# Altium footprint library WR-TBL_Pluggable PCB Header.PcbLib: 719 footprints (part 12 of 45)
Each footprint in its own frame and in the unit in brackets; x right, y up, seen from the top. Pads: shape width x height; smd on the part's side, far side on the other; paste and mask are expansions set on the pad; w line width, h text height; cw(c..) or ccw(c..) is an arc to the next point about the centre after c.
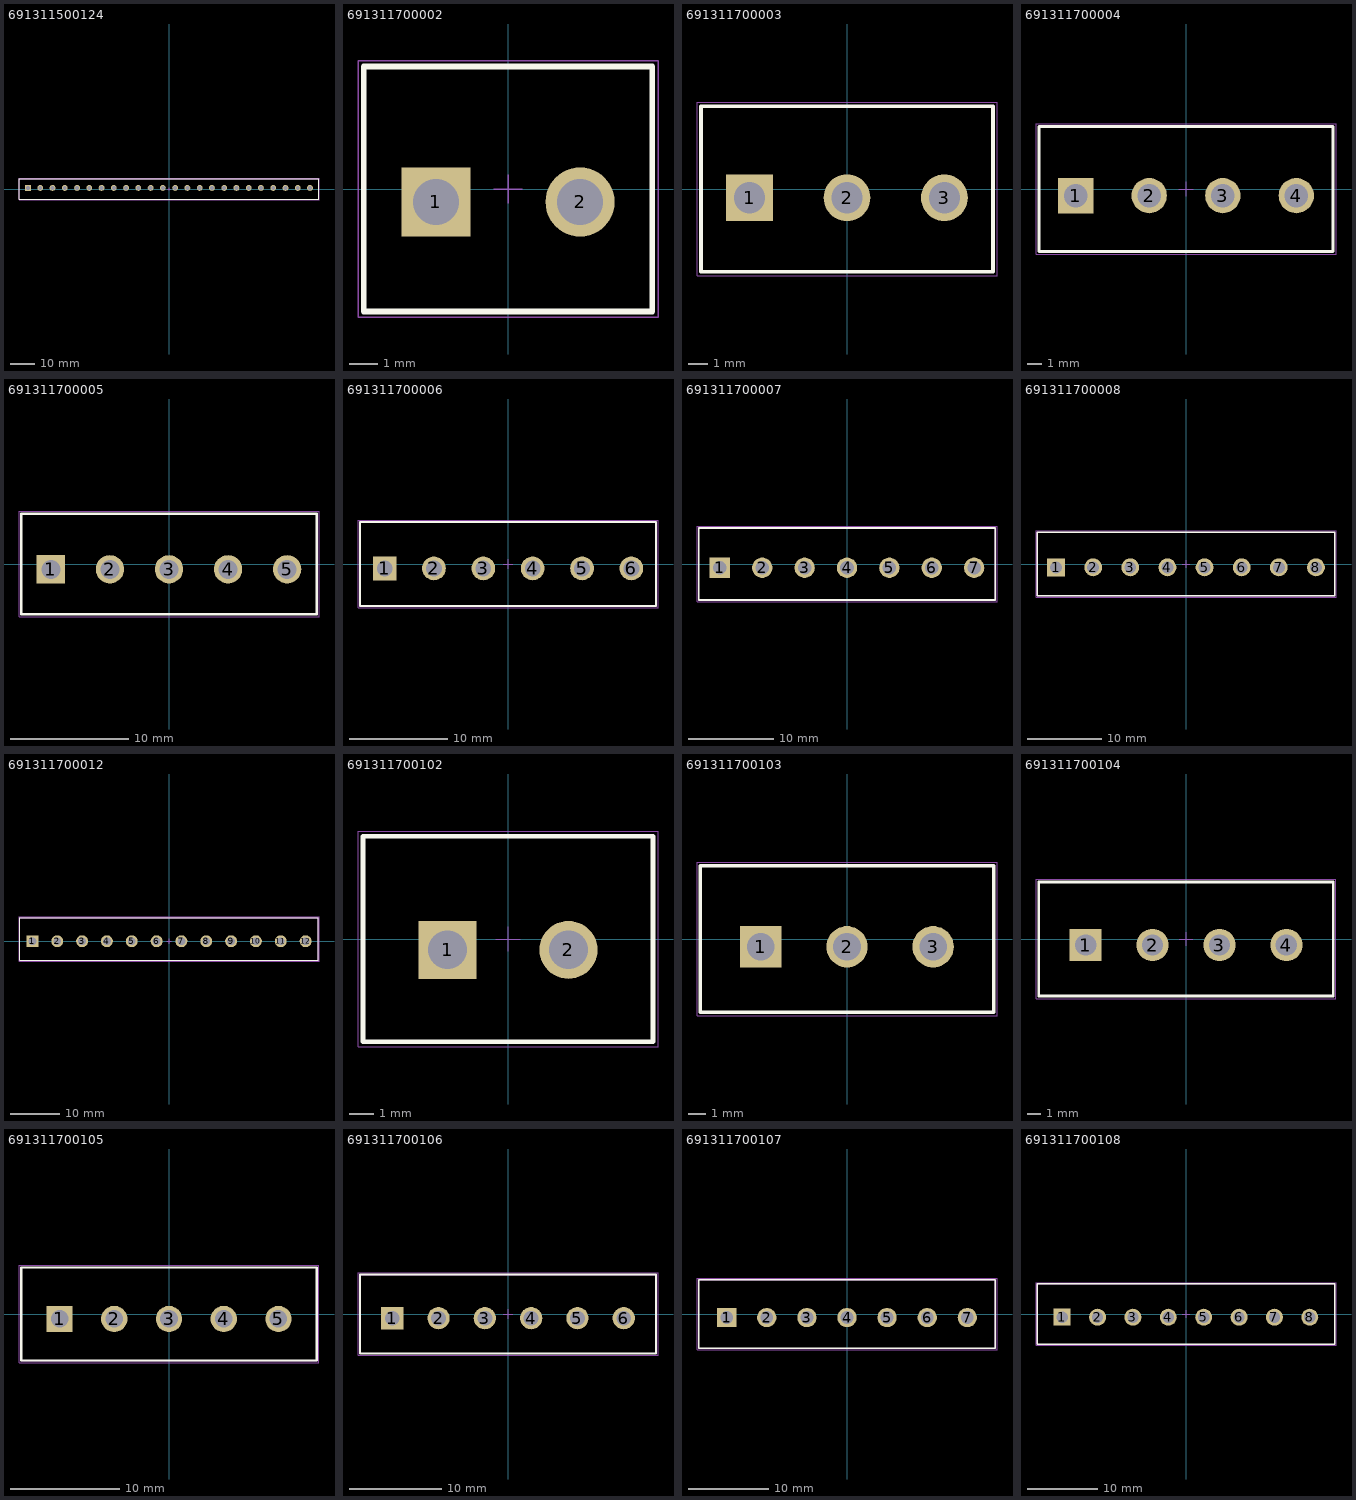
[diagram p11: the footprints below, top view; thin cyan lines are the x and y axes]

## 691311500124 [mm] "5,08mm - PCB Headers - Vertical - Closed ends -24p"
height 12
pads (24):
  rect 2.4x2.4 hole 1.6: 1(-58.42,0.45)
  round 2.4 hole 1.6: 2(-53.34,0.45) 3(-48.26,0.45) 4(-43.18,0.45) 5(-38.1,0.45) 6(-33.02,0.45) 7(-27.94,0.45) 8(-22.86,0.45) 9(-17.78,0.45) 10(-12.7,0.45) 11(-7.62,0.45) 12(-2.54,0.45) 13(2.54,0.45) 14(7.62,0.45) 15(12.7,0.45) 16(17.78,0.45) 17(22.86,0.45) 18(27.94,0.45) 19(33.02,0.45) 20(38.1,0.45) 21(43.18,0.45) 22(48.26,0.45) 23(53.34,0.45) 24(58.42,0.45)
Top Overlay:
  lines w0.2: -61.96,-4.25 61.96,-4.25 61.96,4.25 -61.96,4.25 -61.96,-4.25
Mechanical 13:
  lines w0.1: -61.96,-4.25 -61.96,4.25 61.96,4.25 61.96,-4.25 -61.96,-4.25
Mechanical 15:
  lines w0.05: -0.5,0 0.5,0 ; 0,-0.5 0,0.5 ; -62.16,-4.45 62.16,-4.45 62.16,4.45 -62.16,4.45 -62.16,-4.45
3D body "691311500124.stp": height 12.05, standoff -3.95, extent -61.96,-4.25 61.96,4.25

## 691311700002 [mm] "5.00mm - Open Vertical PCB Header - 02p"
height 12
pads (2):
  rect 2.4x2.4 hole 1.6: 1(-2.5,-0.45)
  round 2.4 hole 1.6: 2(2.5,-0.45)
Top Overlay:
  lines w0.2: -5,-4.25 5,-4.25 5,4.25 -5,4.25 -5,-4.25
Mechanical 13:
  lines w0.1: -5,-4.25 -5,4.25 5,4.25 5,-4.25 -5,-4.25
Mechanical 15:
  lines w0.05: -0.5,0 0.5,0 ; 0,-0.5 0,0.5 ; -5.2,-4.45 5.2,-4.45 5.2,4.45 -5.2,4.45 -5.2,-4.45
3D body "691311700002.stp": height 12.1, standoff -3.9, extent -5,-4.25 5,4.25

## 691311700003 [mm] "5.00mm - Open Vertical PCB Header - 03p"
height 12
pads (3):
  rect 2.4x2.4 hole 1.6: 1(-5,-0.45)
  round 2.4 hole 1.6: 2(0,-0.45) 3(5,-0.45)
Top Overlay:
  lines w0.2: -7.5,-4.25 7.5,-4.25 7.5,4.25 -7.5,4.25 -7.5,-4.25
Mechanical 13:
  lines w0.1: -7.5,-4.25 -7.5,4.25 7.5,4.25 7.5,-4.25 -7.5,-4.25
Mechanical 15:
  lines w0.05: -0.5,0 0.5,0 ; 0,-0.5 0,0.5 ; -7.7,-4.45 7.7,-4.45 7.7,4.45 -7.7,4.45 -7.7,-4.45
3D body "691311700003.stp": height 12.1, standoff -3.9, extent -7.5,-4.25 7.5,4.25

## 691311700004 [mm] "5.00mm - Open Vertical PCB Header - 04p"
height 12
pads (4):
  rect 2.4x2.4 hole 1.6: 1(-7.5,-0.45)
  round 2.4 hole 1.6: 2(-2.5,-0.45) 3(2.5,-0.45) 4(7.5,-0.45)
Top Overlay:
  lines w0.2: -10,-4.25 10,-4.25 10,4.25 -10,4.25 -10,-4.25
Mechanical 13:
  lines w0.1: -10,-4.25 -10,4.25 10,4.25 10,-4.25 -10,-4.25
Mechanical 15:
  lines w0.05: -0.5,0 0.5,0 ; 0,-0.5 0,0.5 ; -10.2,-4.45 10.2,-4.45 10.2,4.45 -10.2,4.45 -10.2,-4.45
3D body "691311700004.stp": height 12.1, standoff -3.9, extent -10,-4.25 10,4.25

## 691311700005 [mm] "5.00mm - Open Vertical PCB Header - 05p"
height 12
pads (5):
  rect 2.4x2.4 hole 1.6: 1(-10,-0.45)
  round 2.4 hole 1.6: 2(-5,-0.45) 3(0,-0.45) 4(5,-0.45) 5(10,-0.45)
Top Overlay:
  lines w0.2: -12.5,-4.25 12.5,-4.25 12.5,4.25 -12.5,4.25 -12.5,-4.25
Mechanical 13:
  lines w0.1: -12.5,-4.25 -12.5,4.25 12.5,4.25 12.5,-4.25 -12.5,-4.25
Mechanical 15:
  lines w0.05: -0.5,0 0.5,0 ; 0,-0.5 0,0.5 ; -12.7,-4.45 12.7,-4.45 12.7,4.45 -12.7,4.45 -12.7,-4.45
3D body "691311700005.stp": height 12.1, standoff -3.9, extent -12.5,-4.25 12.5,4.25

## 691311700006 [mm] "5.00mm - Open Vertical PCB Header - 06p"
height 12
pads (6):
  rect 2.4x2.4 hole 1.6: 1(-12.5,-0.45)
  round 2.4 hole 1.6: 2(-7.5,-0.45) 3(-2.5,-0.45) 4(2.5,-0.45) 5(7.5,-0.45) 6(12.5,-0.45)
Top Overlay:
  lines w0.2: -15,-4.25 -15,4.25 15,4.25 15,-4.25 -15,-4.25
Mechanical 13:
  lines w0.1: -15,-4.25 15,-4.25 15,4.25 -15,4.25 -15,-4.25
Mechanical 15:
  lines w0.05: -0.5,0 0.5,0 ; 0,-0.5 0,0.5 ; -15.2,-4.45 -15.2,4.45 15.2,4.45 15.2,-4.45 -15.2,-4.45
3D body "691311700006.stp": height 12.1, standoff -3.9, extent -15,-4.25 15,4.25

## 691311700007 [mm] "5.00mm - Open Vertical PCB Header - 07p"
height 12
pads (7):
  rect 2.4x2.4 hole 1.6: 1(-15,-0.45)
  round 2.4 hole 1.6: 2(-10,-0.45) 3(-5,-0.45) 4(0,-0.45) 5(5,-0.45) 6(10,-0.45) 7(15,-0.45)
Top Overlay:
  lines w0.2: -17.5,-4.25 -17.5,4.25 17.5,4.25 17.5,-4.25 -17.5,-4.25
Mechanical 13:
  lines w0.1: -17.5,-4.25 17.5,-4.25 17.5,4.25 -17.5,4.25 -17.5,-4.25
Mechanical 15:
  lines w0.05: -0.5,0 0.5,0 ; 0,-0.5 0,0.5 ; -17.7,-4.45 -17.7,4.45 17.7,4.45 17.7,-4.45 -17.7,-4.45
3D body "691311700007.stp": height 12.1, standoff -3.9, extent -17.5,-4.25 17.5,4.25

## 691311700008 [mm] "5.00mm - Open Vertical PCB Header - 08p"
height 12
pads (8):
  rect 2.4x2.4 hole 1.6: 1(-17.5,-0.45)
  round 2.4 hole 1.6: 2(-12.5,-0.45) 3(-7.5,-0.45) 4(-2.5,-0.45) 5(2.5,-0.45) 6(7.5,-0.45) 7(12.5,-0.45) 8(17.5,-0.45)
Top Overlay:
  lines w0.2: -20,-4.25 -20,4.25 20,4.25 20,-4.25 -20,-4.25
Mechanical 13:
  lines w0.1: -20,-4.25 20,-4.25 20,4.25 -20,4.25 -20,-4.25
Mechanical 15:
  lines w0.05: -0.5,0 0.5,0 ; 0,-0.5 0,0.5 ; -20.2,-4.45 -20.2,4.45 20.2,4.45 20.2,-4.45 -20.2,-4.45
3D body "691311700008.stp": height 12.1, standoff -3.9, extent -20,-4.25 20,4.25

## 691311700012 [mm] "5.00mm - Open Vertical PCB Header - 12p"
height 12
pads (12):
  rect 2.4x2.4 hole 1.6: 1(-27.5,0)
  round 2.4 hole 1.6: 2(-22.5,0) 3(-17.5,0) 4(-12.5,0) 5(-7.5,0) 6(-2.5,0) 7(2.5,0) 8(7.5,0) 9(12.5,0) 10(17.5,0) 11(22.5,0) 12(27.5,0)
Top Overlay:
  lines w0.2: -30,-3.8 -30,4.7 30,4.7 30,-3.8 -30,-3.8
Mechanical 13:
  lines w0.1: -30,-3.8 30,-3.8 30,4.7 -30,4.7 -30,-3.8
Mechanical 15:
  lines w0.05: -0.5,0 0.5,0 ; 0,-0.5 0,0.5 ; -30.2,-4 -30.2,4.9 30.2,4.9 30.2,-4 -30.2,-4
3D body "691311700012.stp": height 12.1, standoff -3.9, extent -30,-3.8 30,4.7

## 691311700102 [mm] "5.00mm - PCB Vertical Closed - 02p"
height 12
pads (2):
  rect 2.4x2.4 hole 1.6: 1(-2.5,-0.45)
  round 2.4 hole 1.6: 2(2.5,-0.45)
Top Overlay:
  lines w0.2: -6,-4.25 -6,4.25 6,4.25 6,-4.25 -6,-4.25
Mechanical 13:
  lines w0.1: -6,-4.25 6,-4.25 6,4.25 -6,4.25 -6,-4.25
Mechanical 15:
  lines w0.05: -0.5,0 0.5,0 ; 0,-0.5 0,0.5 ; -6.2,-4.45 6.2,-4.45 6.2,4.45 -6.2,4.45 -6.2,-4.45
3D body "691311700102.stp": height 12.1, standoff -3.9, extent -6,-4.25 6,4.25

## 691311700103 [mm] "5.00mm - PCB Vertical Closed - 03p"
height 12
pads (3):
  rect 2.4x2.4 hole 1.6: 1(-5,-0.45)
  round 2.4 hole 1.6: 2(0,-0.45) 3(5,-0.45)
Top Overlay:
  lines w0.2: -8.5,-4.25 8.5,-4.25 8.5,4.25 -8.5,4.25 -8.5,-4.25
Mechanical 13:
  lines w0.1: -8.5,-4.25 -8.5,4.25 8.5,4.25 8.5,-4.25 -8.5,-4.25
Mechanical 15:
  lines w0.05: -0.5,0 0.5,0 ; 0,-0.5 0,0.5 ; -8.7,-4.45 -8.7,4.45 8.7,4.45 8.7,-4.45 -8.7,-4.45
3D body "691311700103.stp": height 12.1, standoff -3.9, extent -8.5,-4.25 8.5,4.25

## 691311700104 [mm] "5.00mm - PCB Vertical Closed - 04p"
height 12
pads (4):
  rect 2.4x2.4 hole 1.6: 1(-7.5,-0.45)
  round 2.4 hole 1.6: 2(-2.5,-0.45) 3(2.5,-0.45) 4(7.5,-0.45)
Top Overlay:
  lines w0.2: -11,-4.25 11,-4.25 11,4.25 -11,4.25 -11,-4.25
Mechanical 13:
  lines w0.1: -11,-4.25 -11,4.25 11,4.25 11,-4.25 -11,-4.25
Mechanical 15:
  lines w0.05: -0.5,0 0.5,0 ; 0,-0.5 0,0.5 ; -11.2,-4.45 -11.2,4.45 11.2,4.45 11.2,-4.45 -11.2,-4.45
3D body "691311700104.stp": height 12.1, standoff -3.9, extent -11,-4.25 11,4.25

## 691311700105 [mm] "5.00mm - PCB Vertical Closed - 05p"
height 12
pads (5):
  rect 2.4x2.4 hole 1.6: 1(-10,-0.45)
  round 2.4 hole 1.6: 2(-5,-0.45) 3(0,-0.45) 4(5,-0.45) 5(10,-0.45)
Top Overlay:
  lines w0.2: -13.5,-4.25 -13.5,4.25 13.5,4.25 13.5,-4.25 -13.5,-4.25
Mechanical 13:
  lines w0.1: -13.5,-4.25 13.5,-4.25 13.5,4.25 -13.5,4.25 -13.5,-4.25
Mechanical 15:
  lines w0.05: -0.5,0 0.5,0 ; 0,-0.5 0,0.5 ; -13.7,-4.45 13.7,-4.45 13.7,4.45 -13.7,4.45 -13.7,-4.45
3D body "691311700105.stp": height 12.1, standoff -3.9, extent -13.5,-4.25 13.5,4.25

## 691311700106 [mm] "5.00mm - PCB Vertical Closed - 06p"
height 12
pads (6):
  rect 2.4x2.4 hole 1.6: 1(-12.5,-0.45)
  round 2.4 hole 1.6: 2(-7.5,-0.45) 3(-2.5,-0.45) 4(2.5,-0.45) 5(7.5,-0.45) 6(12.5,-0.45)
Top Overlay:
  lines w0.2: -16,-4.25 16,-4.25 16,4.25 -16,4.25 -16,-4.25
Mechanical 13:
  lines w0.1: -16,-4.25 -16,4.25 16,4.25 16,-4.25 -16,-4.25
Mechanical 15:
  lines w0.05: -0.5,0 0.5,0 ; 0,-0.5 0,0.5 ; -16.2,-4.45 -16.2,4.45 16.2,4.45 16.2,-4.45 -16.2,-4.45
3D body "691311700106.stp": height 12.1, standoff -3.9, extent -16,-4.25 16,4.25

## 691311700107 [mm] "5.00mm - PCB Vertical Closed - 07p"
height 12
pads (7):
  rect 2.4x2.4 hole 1.6: 1(-15,-0.45)
  round 2.4 hole 1.6: 2(-10,-0.45) 3(-5,-0.45) 4(0,-0.45) 5(5,-0.45) 6(10,-0.45) 7(15,-0.45)
Top Overlay:
  lines w0.2: -18.5,-4.25 18.5,-4.25 18.5,4.25 -18.5,4.25 -18.5,-4.25
Mechanical 13:
  lines w0.1: -18.5,-4.25 -18.5,4.25 18.5,4.25 18.5,-4.25 -18.5,-4.25
Mechanical 15:
  lines w0.05: -0.5,0 0.5,0 ; 0,-0.5 0,0.5 ; -18.7,-4.45 -18.7,4.45 18.7,4.45 18.7,-4.45 -18.7,-4.45
3D body "691311700107.stp": height 12.1, standoff -3.9, extent -18.5,-4.25 18.5,4.25

## 691311700108 [mm] "5.00mm - PCB Vertical Closed - 08p"
height 12
pads (8):
  rect 2.4x2.4 hole 1.6: 1(-17.5,-0.45)
  round 2.4 hole 1.6: 2(-12.5,-0.45) 3(-7.5,-0.45) 4(-2.5,-0.45) 5(2.5,-0.45) 6(7.5,-0.45) 7(12.5,-0.45) 8(17.5,-0.45)
Top Overlay:
  lines w0.2: -21,-4.25 -21,4.25 21,4.25 21,-4.25 -21,-4.25
Mechanical 13:
  lines w0.1: -21,-4.25 21,-4.25 21,4.25 -21,4.25 -21,-4.25
Mechanical 15:
  lines w0.05: -0.5,0 0.5,0 ; 0,-0.5 0,0.5 ; -21.2,-4.45 21.2,-4.45 21.2,4.45 -21.2,4.45 -21.2,-4.45
3D body "691311700108.stp": height 12.1, standoff -3.9, extent -21,-4.25 21,4.25